# Altium footprint library Connect.PcbLib: 272 footprints (part 3 of 17)
Each footprint in its own frame and in the unit in brackets; x right, y up, seen from the top. Pads: shape width x height; smd on the part's side, far side on the other; paste and mask are expansions set on the pad; w line width, h text height; cw(c..) or ccw(c..) is an arc to the next point about the centre after c.
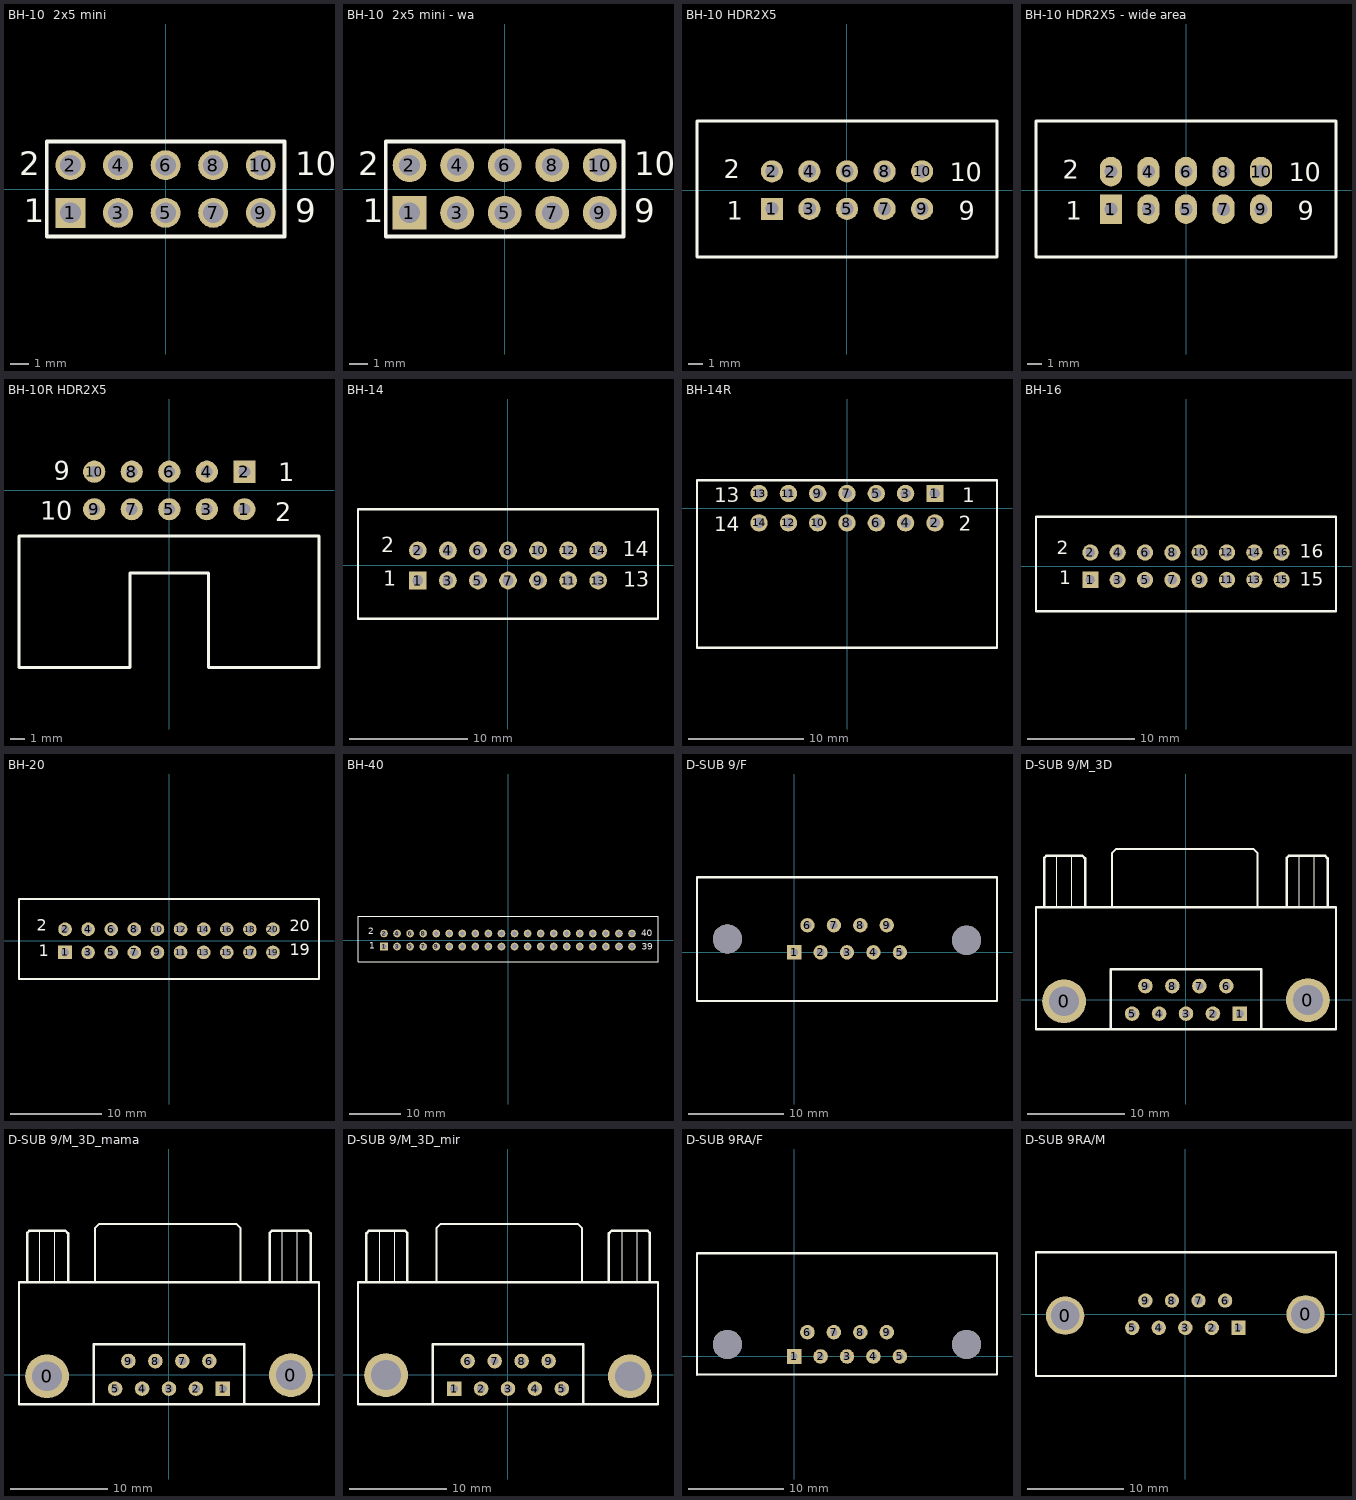
[diagram p2: the footprints below, top view; thin cyan lines are the x and y axes]

## BH-10  2x5 mini [mm] "Connector; Header; 5x2 Position"
pads (10):
  rect 1.6x1.6 hole 1.1: 1(-5.08,-1.27)
  round 1.6 hole 1.1: 2(-5.08,1.27) 3(-2.54,-1.27) 4(-2.54,1.27) 5(0,-1.27) 6(0,1.27) 7(2.54,-1.27) 8(2.54,1.27) 9(5.08,-1.27) 10(5.08,1.27)
Top Overlay:
  lines w0.2: -6.35,-2.54 -6.35,2.54 6.35,2.54 6.35,-2.54 -6.35,-2.54
  text "2" at -7.83,0.73 h1.27
  text "1" at -7.58,-1.77 h1.27
  text "9" at 6.92,-1.77 h1.27
  text "10" at 6.92,0.73 h1.27

## BH-10  2x5 mini - wa [mm] "Connector; Header; 5x2 Position"
pads (10):
  rect 1.8x1.8 hole 1.1: 1(-5.08,-1.27)
  round 1.8 hole 1.1: 2(-5.08,1.27) 3(-2.54,-1.27) 4(-2.54,1.27) 5(0,-1.27) 6(0,1.27) 7(2.54,-1.27) 8(2.54,1.27) 9(5.08,-1.27) 10(5.08,1.27)
Top Overlay:
  lines w0.2: -6.35,-2.54 -6.35,2.54 6.35,2.54 6.35,-2.54 -6.35,-2.54
  text "2" at -7.83,0.73 h1.27
  text "1" at -7.58,-1.77 h1.27
  text "9" at 6.92,-1.77 h1.27
  text "10" at 6.92,0.73 h1.27

## BH-10 HDR2X5 [mm] "Connector; Header; 5x2 Position"
pads (10):
  rect 1.5x1.5 hole 0.9: 1(-5.08,-1.27)
  round 1.5 hole 0.9: 2(-5.08,1.27) 3(-2.54,-1.27) 4(-2.54,1.27) 5(0,-1.27) 6(0,1.27) 7(2.54,-1.27) 8(2.54,1.27) 9(5.08,-1.27) 10(5.08,1.27)
Top Overlay:
  lines w0.2: -10.15,-4.525 -10.15,4.675 10.15,4.675 10.15,-4.525 -10.15,-4.525
  text "2" at -8.35,0.8 h1.27
  text "1" at -8.15,-2 h1.27
  text "9" at 7.55,-2 h1.27
  text "10" at 6.95,0.6 h1.27
3D body "BH-10.STEP": height 9.1, standoff -3, extent -10.25,-4.55 10.25,4.75

## BH-10 HDR2X5 - wide area [mm] "Connector; Header; 5x2 Position"
pads (10):
  rect 1.5x2 hole 0.9: 1(-5.08,-1.27)
  oval 1.5x2 hole 0.9: 2(-5.08,1.27) 3(-2.54,-1.27) 4(-2.54,1.27) 5(0,-1.27) 6(0,1.27) 7(2.54,-1.27) 8(2.54,1.27) 9(5.08,-1.27) 10(5.08,1.27)
Top Overlay:
  lines w0.2: -10.15,-4.52 10.15,-4.52 10.15,4.705 -10.15,4.705 -10.15,-4.52
  text "10" at 6.95,0.6 h1.27
  text "9" at 7.55,-2 h1.27
  text "1" at -8.15,-2 h1.27
  text "2" at -8.35,0.8 h1.27
3D body "BH-10.STEP": height 9.1, standoff -3, extent -10.25,-4.55 10.25,4.75

## BH-10R HDR2X5 [mm] "Connector; Header; 5x2 Position"
pads (10):
  round 1.5 hole 0.8: 1(5.08,-1.27) 3(2.54,-1.27) 4(2.54,1.27) 5(0,-1.27) 6(0,1.27) 7(-2.54,-1.27) 8(-2.54,1.27) 9(-5.08,-1.27) 10(-5.08,1.27)
  rect 1.5x1.5 hole 0.8: 2(5.08,1.27)
Top Overlay:
  lines w0.2: -10.17,-11.97 -10.17,-3.07 10.13,-3.07 10.13,-11.97 2.655,-11.97 2.655,-5.57 -2.645,-5.57 -2.645,-11.97 -10.17,-11.97
  text "10" at -8.72,-1.97 h1.27
  text "9" at -7.82,0.73 h1.27
  text "1" at 7.38,0.63 h1.27
  text "2" at 7.18,-2.07 h1.27
3D body "BH-10.STEP": height 9.28, standoff -0.02, extent -10.27,-11.945 10.23,0.155

## BH-14 [mm] "Connector IDC"
height 9.3
pads (14):
  rect 1.5x1.5 hole 0.9: 1(-7.62,-1.27)
  round 1.5 hole 0.9: 2(-7.62,1.27) 3(-5.08,-1.27) 4(-5.08,1.27) 5(-2.54,-1.27) 6(-2.54,1.27) 7(0,-1.27) 8(0,1.27) 9(2.54,-1.27) 10(2.54,1.27) 11(5.08,-1.27) 12(5.08,1.27) 13(7.62,-1.27) 14(7.62,1.27)
Top Overlay:
  lines w0.2: -12.68,-4.5 12.68,-4.5 12.68,4.75 -12.68,4.75 -12.68,-4.5
  text "1" at -10.53,-1.7 h1.27
  text "2" at -10.73,1.1 h1.27
  text "13" at 9.73,-1.8 h1.27
  text "14" at 9.705,0.8 h1.27
3D body "BH-14M.STEP": height 9.3, standoff -3.1, extent -12.69,-4.4 12.69,4.7

## BH-14R [mm] "Connector IDC"
height 9.3
pads (14):
  rect 1.5x1.5 hole 0.9: 1(7.62,1.27)
  round 1.5 hole 0.9: 2(7.62,-1.27) 3(5.08,1.27) 4(5.08,-1.27) 5(2.54,1.27) 6(2.54,-1.27) 7(0,1.27) 8(0,-1.27) 9(-2.54,1.27) 10(-2.54,-1.27) 11(-5.08,1.27) 12(-5.08,-1.27) 13(-7.62,1.27) 14(-7.62,-1.27)
Top Overlay:
  lines w0.2: -13,-12.1 -13,2.425 13,2.425 13,-12.1 -13,-12.1
  text "14" at -11.5,-2 h1.27
  text "13" at -11.5,0.5 h1.27
  text "2" at 9.7,-1.975 h1.27
  text "1" at 10,0.5 h1.27
3D body "IDC-14L.STEP": height 8.88, standoff -2.47, extent -13.01,-11.985 13.01,1.575

## BH-16 [mm] "Connector IDC"
height 9.3
pads (16):
  rect 1.5x1.5 hole 0.9: 1(-8.89,-1.27)
  round 1.5 hole 0.9: 2(-8.89,1.27) 3(-6.35,-1.27) 4(-6.35,1.27) 5(-3.81,-1.27) 6(-3.81,1.27) 7(-1.27,-1.27) 8(-1.27,1.27) 9(1.27,-1.27) 10(1.27,1.27) 11(3.81,-1.27) 12(3.81,1.27) 13(6.35,-1.27) 14(6.35,1.27) 15(8.89,-1.27) 16(8.89,1.27)
Top Overlay:
  lines w0.2: -13.95,-4.2 13.95,-4.2 13.95,4.6 -13.95,4.6 -13.95,-4.2
  text "16" at 10.565,0.775 h1.27
  text "15" at 10.59,-1.825 h1.27
  text "1" at -11.8,-1.7 h1.27
  text "2" at -12,1.1 h1.27
3D body "BH-16.STEP": height 9.13, standoff -3.27, extent -13.96,-4.25 13.96,4.6

## BH-20 [mm] "Connector IDC"
height 9.3
pads (20):
  rect 1.5x1.5 hole 0.9: 1(-11.43,-1.27)
  round 1.5 hole 0.9: 2(-11.43,1.27) 3(-8.89,-1.27) 4(-8.89,1.27) 5(-6.35,-1.27) 6(-6.35,1.27) 7(-3.81,-1.27) 8(-3.81,1.27) 9(-1.27,-1.27) 10(-1.27,1.27) 11(1.27,-1.27) 12(1.27,1.27) 13(3.81,-1.27) 14(3.81,1.27) 15(6.35,-1.27) 16(6.35,1.27) 17(8.89,-1.27) 18(8.89,1.27) 19(11.43,-1.27) 20(11.43,1.27)
Top Overlay:
  lines w0.2: -16.49,-4.2 -16.49,4.6 16.49,4.6 16.49,-4.2 -16.49,-4.2
  text "2" at -14.54,1.1 h1.27
  text "1" at -14.34,-1.7 h1.27
  text "19" at 13.3,-1.575 h1.27
  text "20" at 13.275,1.025 h1.27
3D body "BH-20.STEP": height 9.13, standoff -3.27, extent -16.5,-4.25 16.5,4.6

## BH-40 [mm] "Connector IDC"
height 9.3
pads (40):
  rect 1.5x1.5 hole 0.9: 1(-24.13,-1.27)
  round 1.5 hole 0.9: 2(-24.13,1.27) 3(-21.59,-1.27) 4(-21.59,1.27) 5(-19.05,-1.27) 6(-19.05,1.27) 7(-16.51,-1.27) 8(-16.51,1.27) 9(-13.97,-1.27) 10(-13.97,1.27) 11(-11.43,-1.27) 12(-11.43,1.27) 13(-8.89,-1.27) 14(-8.89,1.27) 15(-6.35,-1.27) 16(-6.35,1.27) 17(-3.81,-1.27) 18(-3.81,1.27) 19(-1.27,-1.27) 20(-1.27,1.27) 21(1.27,-1.27) 22(1.27,1.27) 23(3.81,-1.27) 24(3.81,1.27) 25(6.35,-1.27) 26(6.35,1.27) 27(8.89,-1.27) 28(8.89,1.27) 29(11.43,-1.27) 30(11.43,1.27) 31(13.97,-1.27) 32(13.97,1.27) 33(16.51,-1.27) 34(16.51,1.27) 35(19.05,-1.27) 36(19.05,1.27) 37(21.59,-1.27) 38(21.59,1.27) 39(24.13,-1.27) 40(24.13,1.27)
Top Overlay:
  lines w0.2: -29.19,-4.2 29.19,-4.2 29.19,4.6 -29.19,4.6 -29.19,-4.2
  text "40" at 25.975,0.725 h1.27
  text "39" at 26,-1.875 h1.27
  text "1" at -27.04,-1.7 h1.27
  text "2" at -27.24,1.1 h1.27
3D body "BH-40.stp": height 9.43, standoff -2.68, extent -29.23,-4.425 29.23,4.675

## D-SUB 9/F [mm]
pads (11):
  rect 1.5x1.5 hole 0.8: 1(0,0)
  round 1.5 hole 0.8: 2(2.769,0) 3(5.537,0) 4(8.306,0) 5(11.074,0) 6(1.397,2.84) 7(4.166,2.84) 8(6.934,2.84) 9(9.703,2.84)
  round 3.048 hole 3.048: ""(-6.985,1.397) ""(18.059,1.27)
Top Overlay:
  lines w0.203: -10.16,-5.08 21.234,-5.08 21.234,7.874
  lines w0.254: -10.16,-5.08 -10.16,7.874 21.234,7.874

## D-SUB 9/M_3D [mm]
pads (11):
  round 4.5 hole 3.048: 0(-12.522,-0.15) 0(12.522,-0.023)
  rect 1.5x1.5 hole 0.8: 1(5.537,-1.42)
  round 1.5 hole 0.8: 2(2.769,-1.42) 3(0,-1.42) 4(-2.769,-1.42) 5(-5.537,-1.42) 6(4.14,1.42) 7(1.372,1.42) 8(-1.397,1.42) 9(-4.166,1.42)
Top Overlay:
  lines w0.1: -13.353,9.497 -13.278,9.497 -13.278,14.822 ; -11.753,9.497 -11.753,14.797 ; -7.603,9.497 -7.528,9.497 ; 11.547,9.497 11.622,9.497 11.622,14.822 ; 13.147,9.497 13.147,14.797
  lines w0.2: -7.603,9.497 -7.603,15.047 -7.153,15.497 6.897,15.497 7.347,15.047 7.347,9.497
  lines w0.254: -14.478,9.497 -14.553,9.497 -14.553,14.572 -14.328,14.797 -10.628,14.797 -10.353,14.522 -10.353,9.497 ; -7.75,-3.005 -7.75,3.12 7.7,3.12 7.725,3.12 7.725,-3.005 ; 10.422,9.497 10.347,9.497 10.347,14.572 10.572,14.797 14.272,14.797 14.547,14.522 14.547,9.497 ; -15.4,-3.005 3.005,-3.005 15.4,-3.005 15.4,9.497 -15.4,9.497 -15.4,-3.005
3D body "D-Sub-9_.step": height 12.75, standoff -3.55, extent -15.355,-2.85 15.455,15.55

## D-SUB 9/M_3D_mama [mm]
pads (11):
  round 4.5 hole 3.048: 0(-12.522,-0.15) 0(12.522,-0.023)
  rect 1.5x1.5 hole 0.8: 1(5.537,-1.42)
  round 1.5 hole 0.8: 2(2.769,-1.42) 3(0,-1.42) 4(-2.769,-1.42) 5(-5.537,-1.42) 6(4.14,1.42) 7(1.372,1.42) 8(-1.397,1.42) 9(-4.166,1.42)
Top Overlay:
  lines w0.1: -13.353,9.497 -13.278,9.497 -13.278,14.822 ; -11.753,9.497 -11.753,14.797 ; -7.603,9.497 -7.528,9.497 ; 11.547,9.497 11.622,9.497 11.622,14.822 ; 13.147,9.497 13.147,14.797
  lines w0.2: -7.603,9.497 -7.603,15.047 -7.153,15.497 6.897,15.497 7.347,15.047 7.347,9.497
  lines w0.254: -14.478,9.497 -14.553,9.497 -14.553,14.572 -14.328,14.797 -10.628,14.797 -10.353,14.522 -10.353,9.497 ; -7.75,-3.005 -7.75,3.12 7.7,3.12 7.725,3.12 7.725,-3.005 ; 10.422,9.497 10.347,9.497 10.347,14.572 10.572,14.797 14.272,14.797 14.547,14.522 14.547,9.497 ; -15.4,-3.005 -15.4,9.497 15.4,9.497 15.4,-3.005 3.005,-3.005 -15.4,-3.005
3D body "D-Sub-9_mama.STEP": height 12.67, standoff -4.2, extent -15.405,-2.95 15.405,15.35

## D-SUB 9/M_3D_mir [mm]
pads (11):
  rect 1.5x1.5 hole 0.8: 1(-5.537,-1.42)
  round 1.5 hole 0.8: 2(-2.769,-1.42) 3(0,-1.42) 4(2.769,-1.42) 5(5.537,-1.42) 6(-4.14,1.42) 7(-1.372,1.42) 8(1.397,1.42) 9(4.166,1.42)
  round 4.5 hole 3.048: ""(-12.522,-0.023) ""(12.522,-0.15)
Top Overlay:
  lines w0.1: -13.147,9.497 -13.147,14.797 ; -11.622,14.822 -11.622,9.497 -11.547,9.497 ; 7.528,9.497 7.603,9.497 ; 11.753,9.497 11.753,14.797 ; 13.278,14.822 13.278,9.497 13.353,9.497
  lines w0.2: -7.347,9.497 -7.347,15.047 -6.897,15.497 7.153,15.497 7.603,15.047 7.603,9.497
  lines w0.254: -14.547,9.497 -14.547,14.522 -14.272,14.797 -10.572,14.797 -10.347,14.572 -10.347,9.497 -10.422,9.497 ; -7.725,-3.005 -7.725,3.12 -7.7,3.12 7.75,3.12 7.75,-3.005 ; 10.353,9.497 10.353,14.522 10.628,14.797 14.328,14.797 14.553,14.572 14.553,9.497 14.478,9.497 ; -15.4,-3.005 -15.4,9.497 15.4,9.497 15.4,-3.005 -3.005,-3.005 -15.4,-3.005

## D-SUB 9RA/F [mil]
pads (11):
  rect 60x60 hole 30: 1(0,0)
  round 60 hole 30: 2(109,0) 3(218,0) 4(327,0) 5(436,0) 6(55,100) 7(164,100) 8(273,100) 9(382,100)
  round 120 hole 120: ""(-275,50) ""(711,50)
Top Overlay:
  lines w8: -400,-75 836,-75 836,425
  lines w10: -400,-75 -400,425 836,425

## D-SUB 9RA/M [mm]
pads (11):
  round 4 hole 3: 0(-12.522,-0.15) 0(12.522,-0.023)
  rect 1.5x1.5 hole 0.8: 1(5.537,-1.42)
  round 1.5 hole 0.8: 2(2.769,-1.42) 3(0,-1.42) 4(-2.769,-1.42) 5(-5.537,-1.42) 6(4.14,1.42) 7(1.372,1.42) 8(-1.397,1.42) 9(-4.166,1.42)
Top Overlay:
  lines w0.203: -15.563,6.454 -15.563,-6.42 15.697,-6.42
  lines w0.254: -15.563,6.454 15.697,6.454 15.697,-6.42
3D body "D-Sub-K122439003-Stig-Wahlstrom.step": height 12.5, standoff -3.7, extent -15.405,-6.275 15.405,6.225